# Altium schematic symbol library IC.SchLib: 555 symbols (part 7 of 15)
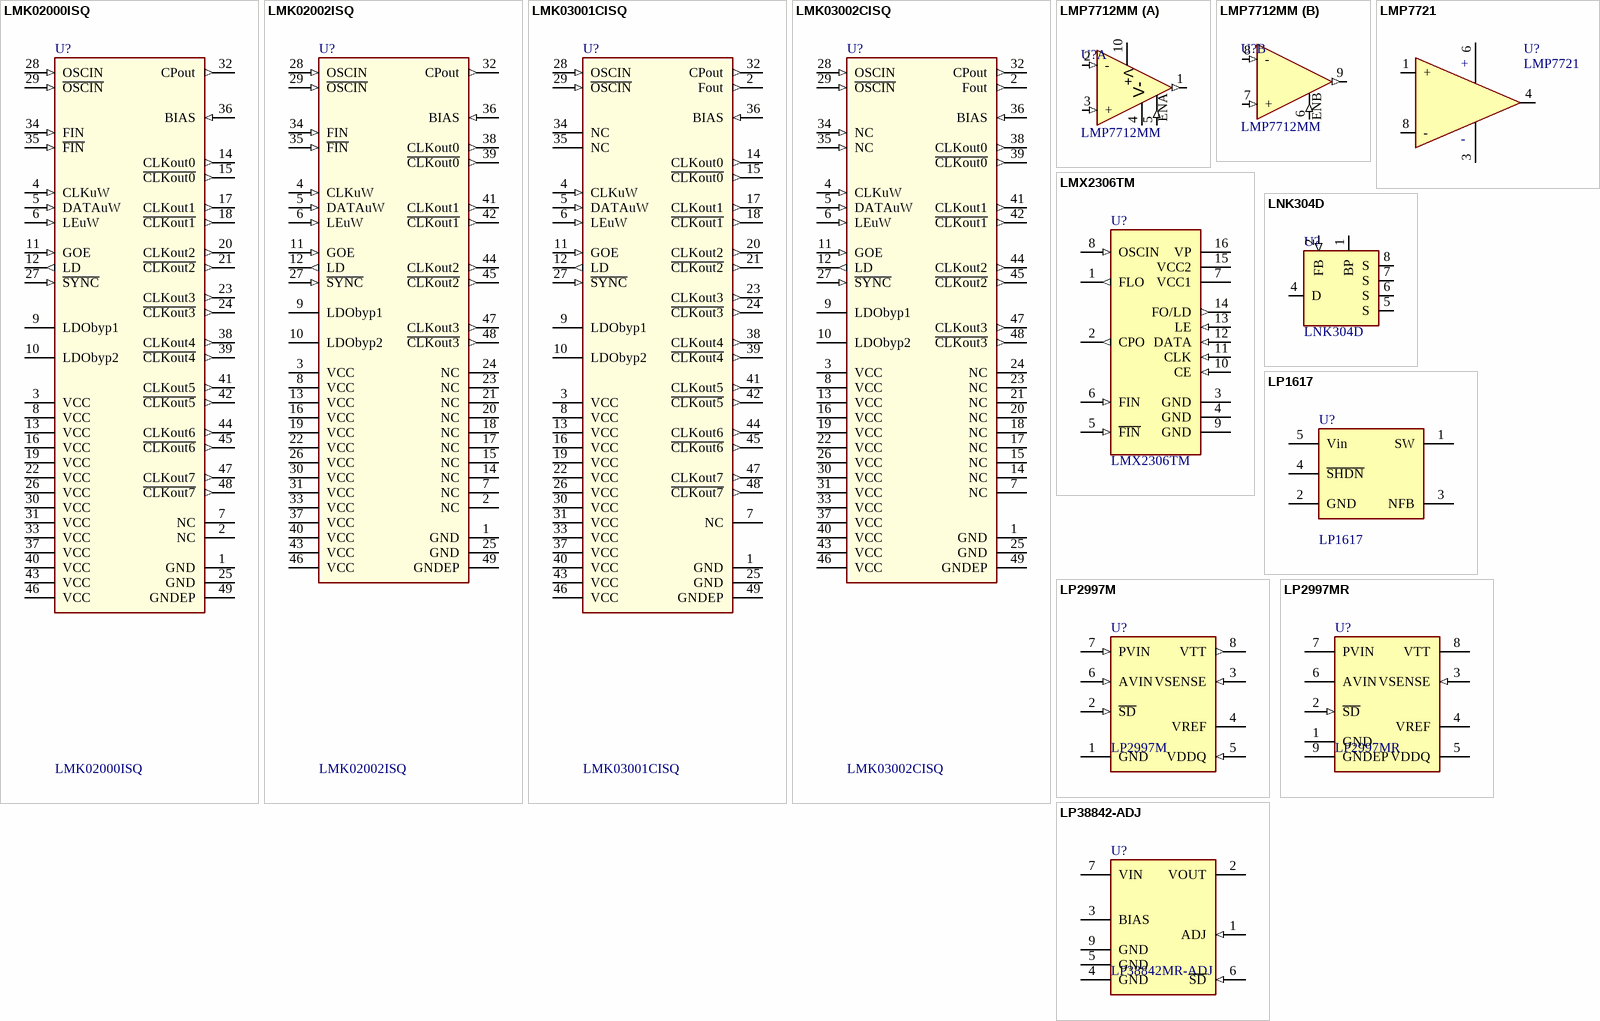
[diagram p76: symbols LMK02000ISQ to LP38842-ADJ]

## LMK03002CISQ
designator U?
Precision Clock Conditioner with Integrated VCO; QFN48; Manufacturer: National Semiconductors; Comment2: 1.64GHz 400fs 3.3V; Sort: 510; Tech: SMDR; Manufacturer No: LMK03002CISQ; Package: QFN48; Price: 0
footprint QFN48-1 (QFN48; 48 Leads; Body Width 7.0 mm; Pitch 0.5 mm)
pins: 1 GND (power), 2 Fout (out), 3 VCC (power), 4 CLKuW (in), 5 DATAuW (in), 6 LEuW (in), 7 NC, 8 VCC (power), 9 LDObyp1, 10 LDObyp2, 11 GOE (in), 12 LD (out), 13 VCC (power), 14 NC, 15 NC, 16 VCC (power), 17 NC, 18 NC, 19 VCC (power), 20 NC, 21 NC, 22 VCC (power), 23 NC, 24 NC, 25 GND (power), 26 VCC (power), 27 ~{SYNC} (in), 28 OSCIN (in), 29 ~{OSCIN} (in), 30 VCC (power), 31 VCC (power), 32 CPout (out), 33 VCC (power), 34 NC (in), 35 NC (in), 36 BIAS (in), 37 VCC (power), 38 CLKout0 (out), 39 ~{CLKout0} (out), 40 VCC (power), 41 CLKout1 (out), 42 ~{CLKout1} (out), 43 VCC (power), 44 CLKout2 (out), 45 ~{CLKout2} (out), 46 VCC (power), 47 CLKout3 (out), 48 ~{CLKout3} (out), 49 GNDEP (power)

## LMP7712MM
designator U?
Precision low noise operational amplifier; Manufacturer: National, Farnell; Manufacturer No: LMP7712MM, 1312609; Comment2: 1.8..5.5Vcc 1.15mAcc 150uVoffs 5.8nVnoise (AD3A); Sort: 510; Tech: SMDR; Package: MSOP10; Price: 2.17
footprint MSOP10-1 (MSOP 10pin 3x3mm R0.5mm)
part A pins: 1 OUT (out), 2 - (in), 3 + (in), 4 -V (power), 5 ENA (in), 10 +V (power)
part B pins: 6 ENA (in), 7 + (in), 8 - (in), 9 OUT (out)
part A text: V+; V-
part B text: ENB

## LMP7721
designator U?
3 Femtoampere Input Bias Current Precision Amplifier; Manufacturer: National Semiconductor; Manufacturer No: LMP7721MA; Sort: 510; Tech: THDW; Package: SOIC8; Price: 0
footprint SOIC8-1
pins: 1 +, 3 V-, 4 OUT, 6 V+, 8 -

## LMX2306TM
designator U?
Low power RF frequency synthesizer 550MHz; Manufacturer: National Semiconductors; Sort: 510; Tech: SMDR; Manufacturer No: LMX2306TM; Package: TSSOP16; Price: 0
footprint TSSOP16 (TSSOP16 5x4.4mm R0.65mm)
pins: 1 FLO (out), 2 CPO (out), 3 GND (power), 4 GND (power), 5 ~{FIN} (in), 6 FIN (in), 7 VCC1 (power), 8 OSCIN (in), 9 GND (power), 10 CE (in), 11 CLK (in), 12 DATA (in), 13 LE (in), 14 FO/LD (out), 15 VCC2 (power), 16 VP (power)

## LNK304D
designator U?
Off-Line Switcher SOIC8; Manufacturer: Power Integrations; Comment2: 120mA, 700V; Sort: 510; Tech: SMDR; Manufacturer No: LNK304D; Package: SOIC8; Price: 0
footprint SOIC8-7 (SOIC8 7pin R1.27mm)
pins: 1 BP, 2 FB (in), 4 D (power), 5 S (power), 6 S (power), 7 S (power), 8 S (power)

## LP1617
designator U?
Micropower Inverting DC/DC Converter in SOT-23; Manufacturer: Linear Technology; Manufacturer No: LT1617ES5; Sort: 510; Tech: SMDR; Package: SOT-23; Price: 0
footprint SOT23-5
pins: 1 SW, 2 GND (power), 3 NFB, 4 ~{SHDN}, 5 Vin (power)

## LP2997M
designator U?
DDR-II Termination Regulator; Manufacturer: National; Sort: 510; Tech: SMDR; Manufacturer No: LP2997M; Package: SOIC8; Price: 0
footprint SOIC8-1
pins: 1 GND (power), 2 ~{SD} (in), 3 VSENSE (in), 4 VREF (power), 5 VDDQ (in), 6 AVIN (in), 7 PVIN (in), 8 VTT (out)

## LP2997MR
designator U?
DDR-II Termination Regulator; Manufacturer: National; Sort: 510; Tech: SMDR; Manufacturer No: LP2997MR; Package: PSOP8; Price: 0
footprint MSOP8 (MSOP 8pin with power pad R0.5mm)
pins: 1 GND (power), 2 ~{SD} (in), 3 VSENSE (in), 4 VREF (power), 5 VDDQ (power), 6 AVIN (power), 7 PVIN (power), 8 VTT (power), 9 GNDEP (power)

## LP38842-ADJ
designator U?, comment LP38842MR-ADJ
LDO regulator PSOP8; Manufacturer: National; Comment2: 5.5Vinmax, 1.5Voutmax, 1.5A 0.115Vdrop; Sort: 510; Tech: SMDR; Manufacturer No: LP38842MR-ADJ; Package: SOIC8 PowerPad; Price: 0
footprint SOIC8PP-1
pins: 1 ADJ (in), 2 VOUT (power), 3 BIAS (power), 4 GND (power), 5 GND (power), 6 ~{SD} (in), 7 VIN (power), 9 GND (power)

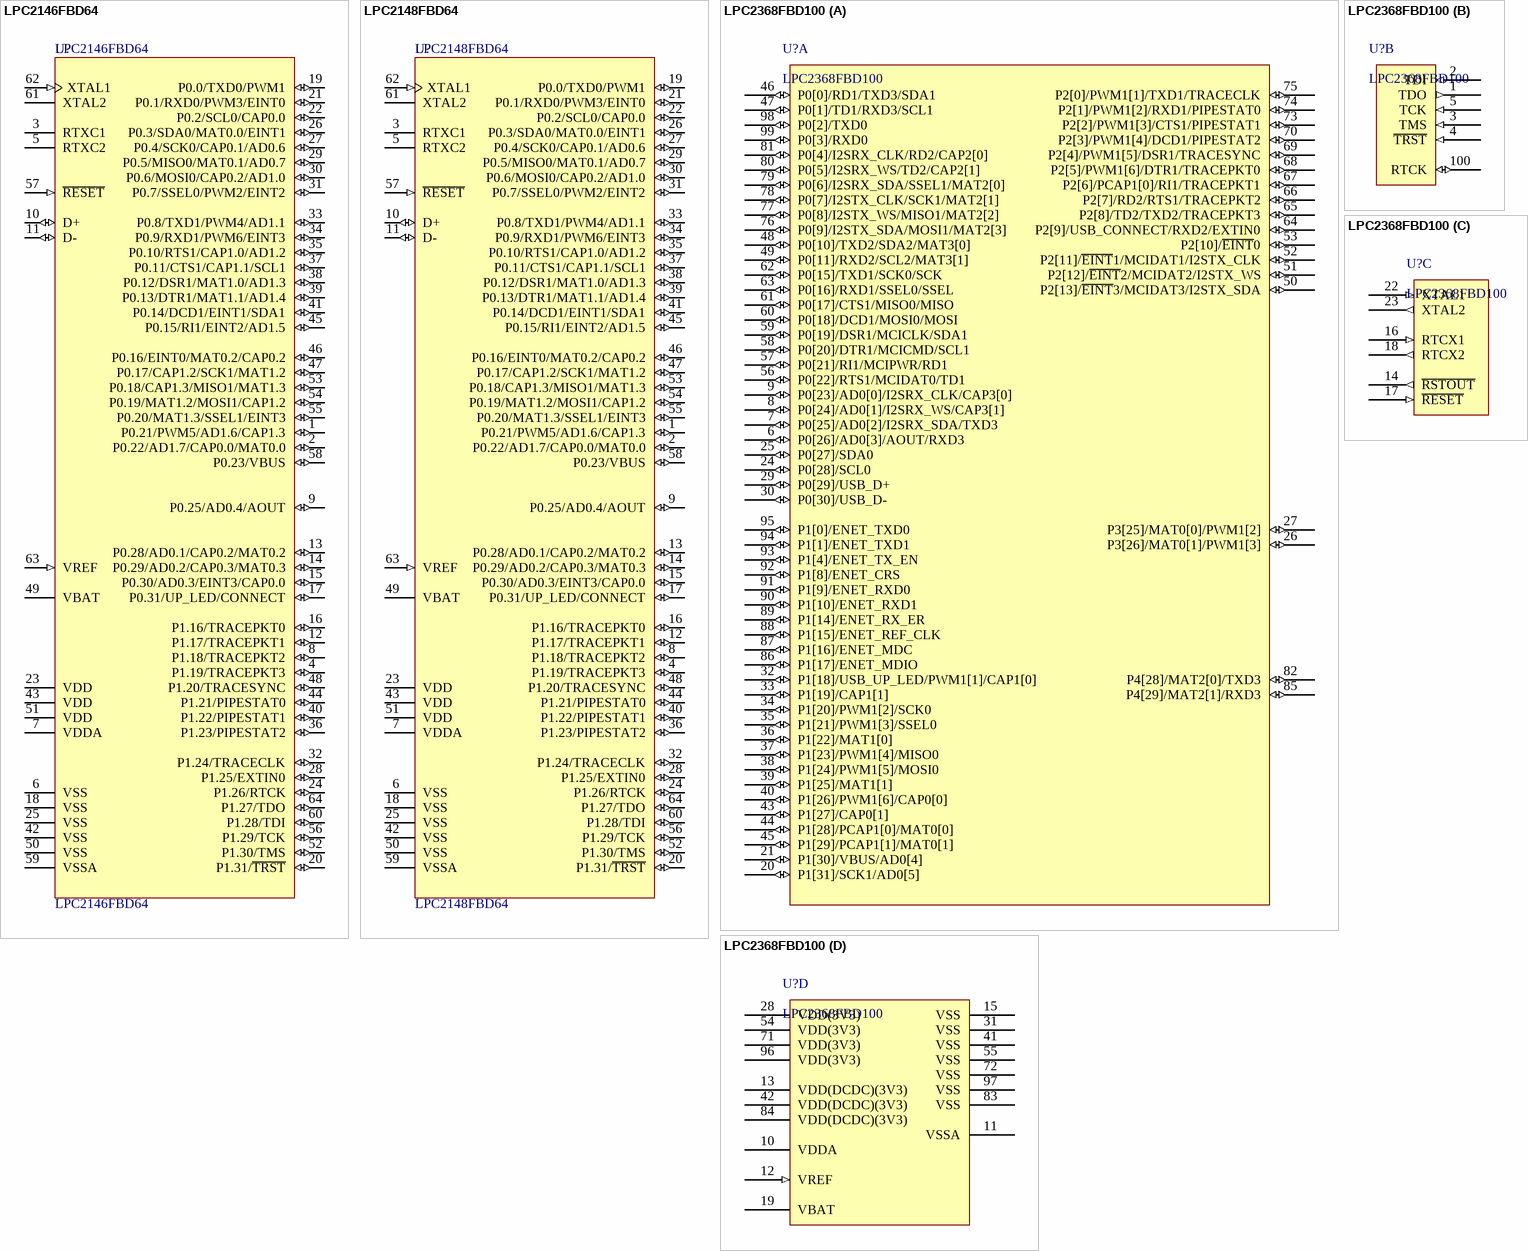
[diagram p27: symbols LPC2146FBD64 to LPC2368FBD100]

## LPC2146FBD64
designator U?
ARM7 16/32-Bit Microcontroller, 256KB Flash, 32KB RAM (+8KB USB DMA shared), 2KB USB RAM, 64-Lead LQFP; Manufacturer: NXP; Sort: 510; Tech: SMDR; Package: SOT314-2; Price: 0; Manufacturer No: LPC2146FBD64
footprint SOT314-2_N (Thin QFP, 64-Leads, Body 10x10mm, Pitch 0.5mm, IPC Medium Density)
pins: 1 P0.21/PWM5/AD1.6/CAP1.3 (io), 2 P0.22/AD1.7/CAP0.0/MAT0.0 (io), 3 RTXC1, 4 P1.19/TRACEPKT3 (io), 5 RTXC2, 6 VSS (power), 7 VDDA (power), 8 P1.18/TRACEPKT2 (io), 9 P0.25/AD0.4/AOUT (io), 10 D+ (io), 11 D- (io), 12 P1.17/TRACEPKT1 (io), 13 P0.28/AD0.1/CAP0.2/MAT0.2 (io), 14 P0.29/AD0.2/CAP0.3/MAT0.3 (io), 15 P0.30/AD0.3/EINT3/CAP0.0 (io), 16 P1.16/TRACEPKT0 (io), 17 P0.31/UP_LED/CONNECT (io), 18 VSS (power), 19 P0.0/TXD0/PWM1 (io), 20 P1.31/~{TRST} (io), 21 P0.1/RXD0/PWM3/EINT0 (io), 22 P0.2/SCL0/CAP0.0 (io), 23 VDD (power), 24 P1.26/RTCK (io), 25 VSS (power), 26 P0.3/SDA0/MAT0.0/EINT1 (io), 27 P0.4/SCK0/CAP0.1/AD0.6 (io), 28 P1.25/EXTIN0 (io), 29 P0.5/MISO0/MAT0.1/AD0.7 (io), 30 P0.6/MOSI0/CAP0.2/AD1.0 (io), 31 P0.7/SSEL0/PWM2/EINT2 (io), 32 P1.24/TRACECLK (io), 33 P0.8/TXD1/PWM4/AD1.1 (io), 34 P0.9/RXD1/PWM6/EINT3 (io), 35 P0.10/RTS1/CAP1.0/AD1.2 (io), 36 P1.23/PIPESTAT2 (io), 37 P0.11/CTS1/CAP1.1/SCL1 (io), 38 P0.12/DSR1/MAT1.0/AD1.3 (io), 39 P0.13/DTR1/MAT1.1/AD1.4 (io), 40 P1.22/PIPESTAT1 (io), 41 P0.14/DCD1/EINT1/SDA1 (io), 42 VSS (power), 43 VDD (power), 44 P1.21/PIPESTAT0 (io), 45 P0.15/RI1/EINT2/AD1.5 (io), 46 P0.16/EINT0/MAT0.2/CAP0.2 (io), 47 P0.17/CAP1.2/SCK1/MAT1.2 (io), 48 P1.20/TRACESYNC (io), 49 VBAT (power), 50 VSS (power), 51 VDD (power), 52 P1.30/TMS (io), 53 P0.18/CAP1.3/MISO1/MAT1.3 (io), 54 P0.19/MAT1.2/MOSI1/CAP1.2 (io), 55 P0.20/MAT1.3/SSEL1/EINT3 (io), 56 P1.29/TCK (io), 57 ~{RESET} (in), 58 P0.23/VBUS (io), 59 VSSA (power), 60 P1.28/TDI (io), 61 XTAL2, 62 XTAL1 (in), 63 VREF (in), 64 P1.27/TDO (io)

## LPC2148FBD64
designator U?
ARM7 16/32-Bit Microcontroller, 512KB Flash, 32KB RAM (+8KB USB DMA shared), 2KB USB RAM, 64-Lead LQFP; Manufacturer: NXP; Sort: 510; Tech: SMDR; Package: SOT314-2; Price: 0; Manufacturer No: LPC2148FBD64
footprint SOT314-2_N (Thin QFP, 64-Leads, Body 10x10mm, Pitch 0.5mm, IPC Medium Density)
pins: 1 P0.21/PWM5/AD1.6/CAP1.3 (io), 2 P0.22/AD1.7/CAP0.0/MAT0.0 (io), 3 RTXC1, 4 P1.19/TRACEPKT3 (io), 5 RTXC2, 6 VSS (power), 7 VDDA (power), 8 P1.18/TRACEPKT2 (io), 9 P0.25/AD0.4/AOUT (io), 10 D+ (io), 11 D- (io), 12 P1.17/TRACEPKT1 (io), 13 P0.28/AD0.1/CAP0.2/MAT0.2 (io), 14 P0.29/AD0.2/CAP0.3/MAT0.3 (io), 15 P0.30/AD0.3/EINT3/CAP0.0 (io), 16 P1.16/TRACEPKT0 (io), 17 P0.31/UP_LED/CONNECT (io), 18 VSS (power), 19 P0.0/TXD0/PWM1 (io), 20 P1.31/~{TRST} (io), 21 P0.1/RXD0/PWM3/EINT0 (io), 22 P0.2/SCL0/CAP0.0 (io), 23 VDD (power), 24 P1.26/RTCK (io), 25 VSS (power), 26 P0.3/SDA0/MAT0.0/EINT1 (io), 27 P0.4/SCK0/CAP0.1/AD0.6 (io), 28 P1.25/EXTIN0 (io), 29 P0.5/MISO0/MAT0.1/AD0.7 (io), 30 P0.6/MOSI0/CAP0.2/AD1.0 (io), 31 P0.7/SSEL0/PWM2/EINT2 (io), 32 P1.24/TRACECLK (io), 33 P0.8/TXD1/PWM4/AD1.1 (io), 34 P0.9/RXD1/PWM6/EINT3 (io), 35 P0.10/RTS1/CAP1.0/AD1.2 (io), 36 P1.23/PIPESTAT2 (io), 37 P0.11/CTS1/CAP1.1/SCL1 (io), 38 P0.12/DSR1/MAT1.0/AD1.3 (io), 39 P0.13/DTR1/MAT1.1/AD1.4 (io), 40 P1.22/PIPESTAT1 (io), 41 P0.14/DCD1/EINT1/SDA1 (io), 42 VSS (power), 43 VDD (power), 44 P1.21/PIPESTAT0 (io), 45 P0.15/RI1/EINT2/AD1.5 (io), 46 P0.16/EINT0/MAT0.2/CAP0.2 (io), 47 P0.17/CAP1.2/SCK1/MAT1.2 (io), 48 P1.20/TRACESYNC (io), 49 VBAT (power), 50 VSS (power), 51 VDD (power), 52 P1.30/TMS (io), 53 P0.18/CAP1.3/MISO1/MAT1.3 (io), 54 P0.19/MAT1.2/MOSI1/CAP1.2 (io), 55 P0.20/MAT1.3/SSEL1/EINT3 (io), 56 P1.29/TCK (io), 57 ~{RESET} (in), 58 P0.23/VBUS (io), 59 VSSA (power), 60 P1.28/TDI (io), 61 XTAL2, 62 XTAL1 (in), 63 VREF (in), 64 P1.27/TDO (io)

## LPC2368FBD100
designator U?
ARM7 16/32-Bit Microcontroller, 512KB Flash, 58KB RAM, 4 Channel CAN, 100-Lead LQFP; Code_IEC: 136E20; Published: 17-Aug-2007; DatasheetVersion: rev.01, Jan-2007; PackageVersion: Feb-2003; PackageReference: SOT407-1; Publisher: Altium Limited; PackageDescription: 100-Pin Plastic Low Profile Quad Flat Pack, LQFP100; Code_JEDEC: MS-026; ComponentLink1Description: Manufacturer Link; ComponentLink1URL: http://www.nxp.com/; ComponentLink2Description: Datasheet; ComponentLink2URL: http://www.standardics.nxp.com/products/lpc2000/datasheet/lpc2364.lpc2366.lpc2368.pdf
footprint SOT407-1_N (Thin QFP, 100-Leads, Body 14x14mm, Pitch 0.5mm, IPC Medium Density)
footprint SOT407-1_L (Thin QFP, 100-Leads, Body 14x14mm, Pitch 0.5mm, IPC High Density)
footprint SOT407-1_M (Thin QFP, 100-Leads, Body 14x14mm, Pitch 0.5mm, IPC Low Density)
3D model LPC2368-QFP100 (100-Pin Plastic Low Profile Quad Flat Pack, LQFP100)
part A pins: 6 P0[26]/AD0[3]/AOUT/RXD3 (io), 7 P0[25]/AD0[2]/I2SRX_SDA/TXD3 (io), 8 P0[24]/AD0[1]/I2SRX_WS/CAP3[1] (io), 9 P0[23]/AD0[0]/I2SRX_CLK/CAP3[0] (io), 20 P1[31]/SCK1/AD0[5] (io), 21 P1[30]/VBUS/AD0[4] (io), 24 P0[28]/SCL0 (io), 25 P0[27]/SDA0 (io), 26 P3[26]/MAT0[1]/PWM1[3] (io), 27 P3[25]/MAT0[0]/PWM1[2] (io), 29 P0[29]/USB_D+ (io), 30 P0[30]/USB_D- (io), 32 P1[18]/USB_UP_LED/PWM1[1]/CAP1[0] (io), 33 P1[19]/CAP1[1] (io), 34 P1[20]/PWM1[2]/SCK0 (io), 35 P1[21]/PWM1[3]/SSEL0 (io), 36 P1[22]/MAT1[0] (io), 37 P1[23]/PWM1[4]/MISO0 (io), 38 P1[24]/PWM1[5]/MOSI0 (io), 39 P1[25]/MAT1[1] (io), 40 P1[26]/PWM1[6]/CAP0[0] (io), 43 P1[27]/CAP0[1] (io), 44 P1[28]/PCAP1[0]/MAT0[0] (io), 45 P1[29]/PCAP1[1]/MAT0[1] (io), 46 P0[0]/RD1/TXD3/SDA1 (io), 47 P0[1]/TD1/RXD3/SCL1 (io), 48 P0[10]/TXD2/SDA2/MAT3[0] (io), 49 P0[11]/RXD2/SCL2/MAT3[1] (io), 50 P2[13]/~{EINT}3/MCIDAT3/I2STX_SDA (io), 51 P2[12]/~{EINT}2/MCIDAT2/I2STX_WS (io), 52 P2[11]/~{EINT}1/MCIDAT1/I2STX_CLK (io), 53 P2[10]/~{EINT}0 (io), 56 P0[22]/RTS1/MCIDAT0/TD1 (io), 57 P0[21]/RI1/MCIPWR/RD1 (io), 58 P0[20]/DTR1/MCICMD/SCL1 (io), 59 P0[19]/DSR1/MCICLK/SDA1 (io), 60 P0[18]/DCD1/MOSI0/MOSI (io), 61 P0[17]/CTS1/MISO0/MISO (io), 62 P0[15]/TXD1/SCK0/SCK (io), 63 P0[16]/RXD1/SSEL0/SSEL (io), 64 P2[9]/USB_CONNECT/RXD2/EXTIN0 (io), 65 P2[8]/TD2/TXD2/TRACEPKT3 (io), 66 P2[7]/RD2/RTS1/TRACEPKT2 (io), 67 P2[6]/PCAP1[0]/RI1/TRACEPKT1 (io), 68 P2[5]/PWM1[6]/DTR1/TRACEPKT0 (io), 69 P2[4]/PWM1[5]/DSR1/TRACESYNC (io), 70 P2[3]/PWM1[4]/DCD1/PIPESTAT2 (io), 73 P2[2]/PWM1[3]/CTS1/PIPESTAT1 (io), 74 P2[1]/PWM1[2]/RXD1/PIPESTAT0 (io), 75 P2[0]/PWM1[1]/TXD1/TRACECLK (io), 76 P0[9]/I2STX_SDA/MOSI1/MAT2[3] (io), 77 P0[8]/I2STX_WS/MISO1/MAT2[2] (io), 78 P0[7]/I2STX_CLK/SCK1/MAT2[1] (io), 79 P0[6]/I2SRX_SDA/SSEL1/MAT2[0] (io), 80 P0[5]/I2SRX_WS/TD2/CAP2[1] (io), 81 P0[4]/I2SRX_CLK/RD2/CAP2[0] (io), 82 P4[28]/MAT2[0]/TXD3 (io), 85 P4[29]/MAT2[1]/RXD3 (io), 86 P1[17]/ENET_MDIO (io), 87 P1[16]/ENET_MDC (io), 88 P1[15]/ENET_REF_CLK (io), 89 P1[14]/ENET_RX_ER (io), 90 P1[10]/ENET_RXD1 (io), 91 P1[9]/ENET_RXD0 (io), 92 P1[8]/ENET_CRS (io), 93 P1[4]/ENET_TX_EN (io), 94 P1[1]/ENET_TXD1 (io), 95 P1[0]/ENET_TXD0 (io), 98 P0[2]/TXD0 (io), 99 P0[3]/RXD0 (io)
part B pins: 1 TDO (out), 2 TDI (in), 3 TMS (in), 4 ~{TRST} (in), 5 TCK (in), 100 RTCK (io)
part C pins: 14 ~{RSTOUT} (out), 16 RTCX1 (in), 17 ~{RESET} (in), 18 RTCX2 (out), 22 XTAL1 (in), 23 XTAL2 (out)
part D pins: 10 VDDA (power), 11 VSSA (power), 12 VREF (in), 13 VDD(DCDC)(3V3) (power), 15 VSS (power), 19 VBAT (power), 28 VDD(3V3) (power), 31 VSS (power), 41 VSS (power), 42 VDD(DCDC)(3V3) (power), 54 VDD(3V3) (power), 55 VSS (power), 71 VDD(3V3) (power), 72 VSS (power), 83 VSS (power), 84 VDD(DCDC)(3V3) (power), 96 VDD(3V3) (power), 97 VSS (power)

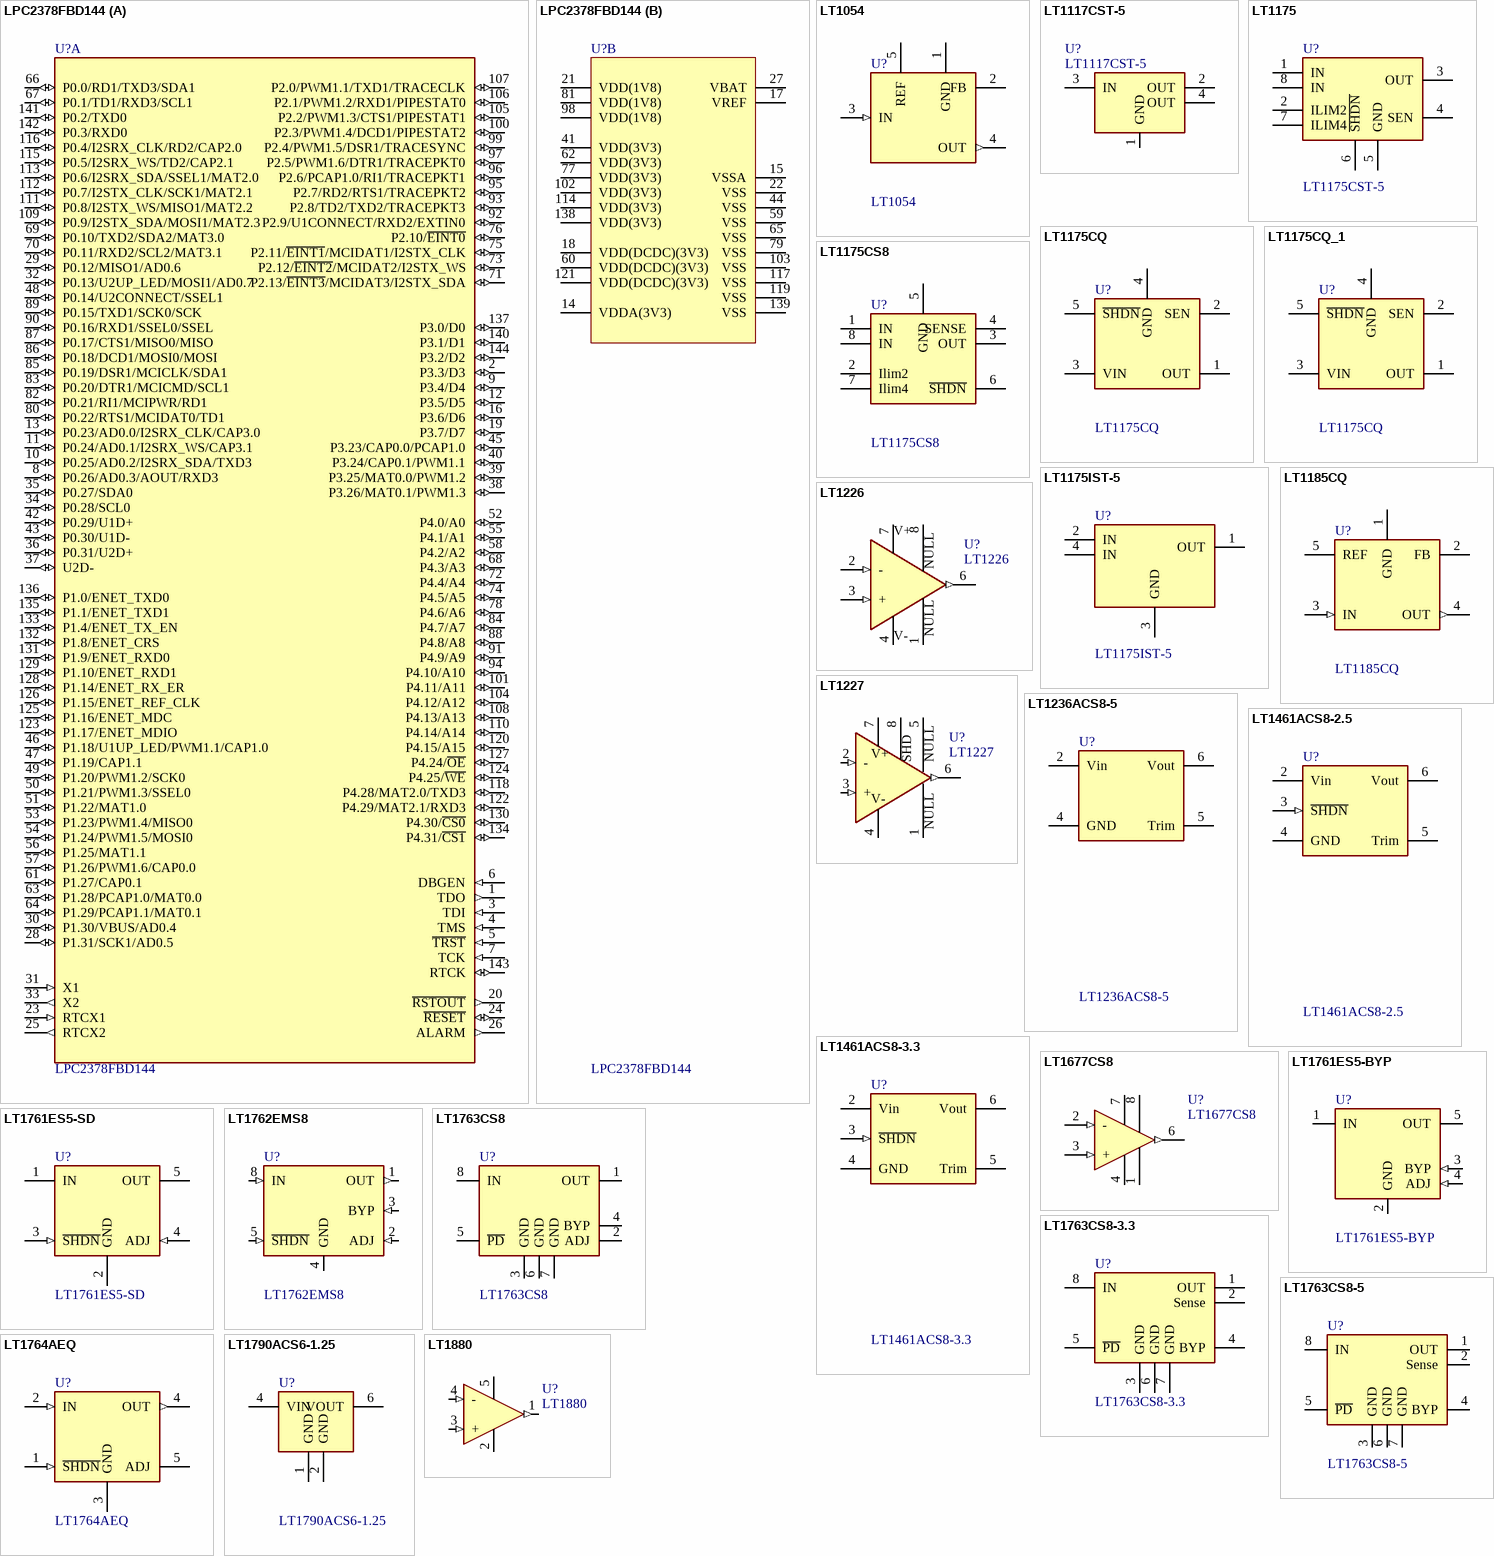
[diagram p28: symbols LPC2378FBD144 to LT1880]

## LPC2378FBD144
designator U?
ARM7 16/32-Bit Microcontroller, 512KB Flash, 58KB RAM, Ethernet, USB2, 144-Lead LQFP; Manufacturer: NXP; Sort: 510; Tech: SMDR; Package: LQFP144; Manufacturer No: LPC2378FBD144; Price: 0
footprint SOT486-1_N (Thin QFP, 144-Leads, Body 20x20mm, Pitch 0.5mm, IPC Medium Density)
part A pins: 1 TDO (out), 2 P3.3/D3 (io), 3 TDI (in), 4 TMS (in), 5 ~{TRST} (in), 6 DBGEN (in), 7 TCK (in), 8 P0.26/AD0.3/AOUT/RXD3 (io), 9 P3.4/D4 (io), 10 P0.25/AD0.2/I2SRX_SDA/TXD3 (io), 11 P0.24/AD0.1/I2SRX_WS/CAP3.1 (io), 12 P3.5/D5 (io), 13 P0.23/AD0.0/I2SRX_CLK/CAP3.0 (io), 16 P3.6/D6 (io), 19 P3.7/D7 (io), 20 ~{RSTOUT} (out), 23 RTCX1 (in), 24 ~{RESET} (io), 25 RTCX2 (out), 26 ALARM (out), 28 P1.31/SCK1/AD0.5 (io), 29 P0.12/MISO1/AD0.6 (io), 30 P1.30/VBUS/AD0.4 (io), 31 X1 (in), 32 P0.13/U2UP_LED/MOSI1/AD0.7 (io), 33 X2 (out), 34 P0.28/SCL0 (io), 35 P0.27/SDA0 (io), 36 P0.31/U2D+ (io), 37 U2D- (io), 38 P3.26/MAT0.1/PWM1.3 (io), 39 P3.25/MAT0.0/PWM1.2 (io), 40 P3.24/CAP0.1/PWM1.1 (io), 42 P0.29/U1D+ (io), 43 P0.30/U1D- (io), 45 P3.23/CAP0.0/PCAP1.0 (io), 46 P1.18/U1UP_LED/PWM1.1/CAP1.0 (io), 47 P1.19/CAP1.1 (io), 48 P0.14/U2CONNECT/SSEL1 (io), 49 P1.20/PWM1.2/SCK0 (io), 50 P1.21/PWM1.3/SSEL0 (io), 51 P1.22/MAT1.0 (io), 52 P4.0/A0 (io), 53 P1.23/PWM1.4/MISO0 (io), 54 P1.24/PWM1.5/MOSI0 (io), 55 P4.1/A1 (io), 56 P1.25/MAT1.1 (io), 57 P1.26/PWM1.6/CAP0.0 (io), 58 P4.2/A2 (io), 61 P1.27/CAP0.1 (io), 63 P1.28/PCAP1.0/MAT0.0 (io), 64 P1.29/PCAP1.1/MAT0.1 (io), 66 P0.0/RD1/TXD3/SDA1 (io), 67 P0.1/TD1/RXD3/SCL1 (io), 68 P4.3/A3 (io), 69 P0.10/TXD2/SDA2/MAT3.0 (io), 70 P0.11/RXD2/SCL2/MAT3.1 (io), 71 P2.13/~{EINT3}/MCIDAT3/I2STX_SDA (io), 72 P4.4/A4 (io), 73 P2.12/~{EINT2}/MCIDAT2/I2STX_WS (io), 74 P4.5/A5 (io), 75 P2.11/~{EINT1}/MCIDAT1/I2STX_CLK (io), 76 P2.10/~{EINT0} (io), 78 P4.6/A6 (io), 80 P0.22/RTS1/MCIDAT0/TD1 (io), 82 P0.21/RI1/MCIPWR/RD1 (io), 83 P0.20/DTR1/MCICMD/SCL1 (io), 84 P4.7/A7 (io), 85 P0.19/DSR1/MCICLK/SDA1 (io), 86 P0.18/DCD1/MOSI0/MOSI (io), 87 P0.17/CTS1/MISO0/MISO (io), 88 P4.8/A8 (io), 89 P0.15/TXD1/SCK0/SCK (io), 90 P0.16/RXD1/SSEL0/SSEL (io), 91 P4.9/A9 (io), 92 P2.9/U1CONNECT/RXD2/EXTIN0 (io), 93 P2.8/TD2/TXD2/TRACEPKT3 (io), 94 P4.10/A10 (io), 95 P2.7/RD2/RTS1/TRACEPKT2 (io), 96 P2.6/PCAP1.0/RI1/TRACEPKT1 (io), 97 P2.5/PWM1.6/DTR1/TRACEPKT0 (io), 99 P2.4/PWM1.5/DSR1/TRACESYNC (io), 100 P2.3/PWM1.4/DCD1/PIPESTAT2 (io), 101 P4.11/A11 (io), 104 P4.12/A12 (io), 105 P2.2/PWM1.3/CTS1/PIPESTAT1 (io), 106 P2.1/PWM1.2/RXD1/PIPESTAT0 (io), 107 P2.0/PWM1.1/TXD1/TRACECLK (io), 108 P4.13/A13 (io), 109 P0.9/I2STX_SDA/MOSI1/MAT2.3 (io), 110 P4.14/A14 (io), 111 P0.8/I2STX_WS/MISO1/MAT2.2 (io), 112 P0.7/I2STX_CLK/SCK1/MAT2.1 (io), 113 P0.6/I2SRX_SDA/SSEL1/MAT2.0 (io), 115 P0.5/I2SRX_WS/TD2/CAP2.1 (io), 116 P0.4/I2SRX_CLK/RD2/CAP2.0 (io), 118 P4.28/MAT2.0/TXD3 (io), 120 P4.15/A15 (io), 122 P4.29/MAT2.1/RXD3 (io), 123 P1.17/ENET_MDIO (io), 124 P4.25/~{WE} (io), 125 P1.16/ENET_MDC (io), 126 P1.15/ENET_REF_CLK (io), 127 P4.24/~{OE} (io), 128 P1.14/ENET_RX_ER (io), 129 P1.10/ENET_RXD1 (io), 130 P4.30/~{CS0} (io), 131 P1.9/ENET_RXD0 (io), 132 P1.8/ENET_CRS (io), 133 P1.4/ENET_TX_EN (io), 134 P4.31/~{CS1} (io), 135 P1.1/ENET_TXD1 (io), 136 P1.0/ENET_TXD0 (io), 137 P3.0/D0 (io), 140 P3.1/D1 (io), 141 P0.2/TXD0 (io), 142 P0.3/RXD0 (io), 143 RTCK (io), 144 P3.2/D2 (io)
part B pins: 14 VDDA(3V3) (power), 15 VSSA (power), 17 VREF (power), 18 VDD(DCDC)(3V3) (power), 21 VDD(1V8) (power), 22 VSS (power), 27 VBAT (power), 41 VDD(3V3) (power), 44 VSS (power), 59 VSS (power), 60 VDD(DCDC)(3V3) (power), 62 VDD(3V3) (power), 65 VSS (power), 77 VDD(3V3) (power), 79 VSS (power), 81 VDD(1V8) (power), 98 VDD(1V8) (power), 102 VDD(3V3) (power), 103 VSS (power), 114 VDD(3V3) (power), 117 VSS (power), 119 VSS (power), 121 VDD(DCDC)(3V3) (power), 138 VDD(3V3) (power), 139 VSS (power)

## LT1054
designator U?
Switched-Capacitor Voltage  Converter with Regulator; Manufacturer: Linear Technologies; Manufacturer No: LT1054CS8; Comment2: 3.5V to 16V, 100mA; Sort: 510; Tech: SMDR; Package: SO8; Price: 0
footprint SO8
pins: 1 GND (power), 2 FB, 3 IN (in), 4 OUT (out), 5 REF

## LT1117CST-5
designator U?
+5V LDO regulator SOT223; Manufacturer No: LT1117CST-5#PBF, 1503421; Manufacturer: Linear, Farnell; Sort: 520; Tech: SMDR; Comment2: 6..12Vin 5Vout 0.8Aout; Package: SOT223; Price: 4.2
footprint SOT223
pins: 1 GND (power), 2 OUT (power), 3 IN (power), 4 OUT (power)

## LT1175
designator U?, comment LT1175CST-5
500mA Negative Low Dropout Micropower  Regulator; Manufacturer: Linear Technologies; Comment2: -5V, 0.5A, max -20Vin; Sort: 510; Tech: SMDR; Manufacturer No: LT1175CST-5; Package: SOT223; Price: 0
footprint SOIC8-1
pins: 1 IN (power), 2 ILIM2 (power), 3 OUT, 4 SEN, 5 GND (power), 6 ~{SHDN} (power), 7 ILIM4 (power), 8 IN

## LT1175CQ
designator U?
500mA Negative Low Dropout Micropower  Regulator; Manufacturer: Linear, Farnell; Manufacturer No: LT1175CQ#PBF, 1663389; Comment2: adj 0.5A, max -20Vin; Sort: 510; Tech: SMDR; Package: DDPAK; Price: 7
footprint DDPAK
pins: 1 OUT, 2 SEN, 3 VIN (power), 4 GND (power), 5 ~{SHDN} (power)

## LT1175CQ_1
designator U?, comment LT1175CQ
500mA Negative Low Dropout Micropower  Regulator; Manufacturer: Linear, Farnell; Manufacturer No: LT1175CQ#PBF, 1663389; Comment2: adj 0.5A, max -20Vin; Sort: 510; Tech: SMDR; Package: DDPAK; Price: 7
footprint DDPAK
pins: 1 OUT, 2 SEN, 3 VIN (power), 4 GND (power), 5 ~{SHDN} (power)

## LT1175CS8
designator U?
500mA Negative  Low Dropout Micropower  Regulator; Manufacturer: Linear Technologies; Sort: 510; Tech: SMDR; Manufacturer No: LT1175CS8; Package: SOIC8; Price: 0
footprint SO8
pins: 1 IN, 2 Ilim2, 3 OUT, 4 SENSE, 5 GND, 6 ~{SHDN}, 7 Ilim4, 8 IN

## LT1175IST-5
designator U?
500mA Negative Low Dropout Micropower  Regulator; Manufacturer: Linear, Farnell; Manufacturer No: LT1175CST-5#PBF, 1663391; Comment2: -5V, 0.5A, max -20Vin; Sort: 510; Tech: SMDR; Package: SOT223; Price: 6.3
footprint SOT223
pins: 1 OUT, 2 IN (power), 3 GND (power), 4 IN (power)

## LT1185CQ
designator U?
Negative Low drop regulator 3A; Manufacturer: Linear Technologies, Farnell; Manufacturer No: LT1185CQ#PBF; Comment2: adjVout 30Vin 3A 0.75Vdrop; Sort: 510; Tech: SMDR; Package: DDPak5; Price: 7.29; Supplier: Digi-Key; Supplier No: LT1185CQ#PBF-ND
footprint DDPAK
pins: 1 GND (power), 2 FB, 3 IN (in), 4 OUT (out), 5 REF

## LT1226
designator U?
Low Noise Very High Speed  Operational Amplifier; Manufacturer: Linear Tecnologies; Manufacturer No: LT1226CS8; Sort: 510; Tech: SMDR; Package: SOIC 8; Price: 0
footprint SOIC8-1
pins: 1 NULL, 2 - (in), 3 + (in), 4 -VS (power), 5 NC hidden, 6 OUT (out), 7 +VS (power), 8 NULL
text: V+; V-

## LT1227
designator U?
140MHz Video Current  Feedback Amplifier; Manufacturer: Linear Tecnology, Fanell, Digi-Key; Manufacturer No: LT1227CS8#PBF, 9560319, LT1227CS8#PBF-ND; Sort: 510; Tech: SMDR; Package: SOIC8; Price: 0
footprint SOIC8-1
pins: 1 NULL, 2 - (in), 3 + (in), 4 -VS (power), 5 NC hidden, 5 NULL, 6 OUT (out), 7 +VS (power), 8 +VS (power)
text: V+; SHD; V-

## LT1236ACS8-5
designator U?
5V precision reference; Manufacturer: Linear Technologies, Farnell; Manufacturer No: LT1236ACS8-5#PBF, 1273433; Comment2: 40Vin 5Vout 2ppm 0.05%; Sort: 510; Tech: SMDR; Package: SOIC8; Price: 0
footprint SOIC8-1
pins: 2 Vin (power), 4 GND (power), 5 Trim, 6 Vout (power)

## LT1461ACS8-2.5
designator U?
2.5V precision reference; Manufacturer: Linear Technologies, Farnell; Comment2: 20Vin 2.5Vout 3ppm 0.04%; Sort: 510; Tech: SMDR; Manufacturer No: LT1461ACS8-2.5; Package: SOIC8; Price: 0
footprint SOIC8-1
pins: 2 Vin (power), 3 ~{SHDN} (in), 4 GND (power), 5 Trim, 6 Vout (power)

## LT1461ACS8-3.3
designator U?
3.3V precision reference; Manufacturer: Linear Technologies, Farnell; Comment2: 20Vin 3.3Vout 3ppm 0.04%; Sort: 510; Tech: SMDR; Manufacturer No: LT1461ACS8-3.3; Package: SOIC8; Price: 0
footprint SOIC8-1
pins: 2 Vin (power), 3 ~{SHDN} (in), 4 GND (power), 5 Trim, 6 Vout (power)

## LT1677CS8
designator U?
Operational amplifier low noise 44V supply; Manufacturer: Linear Tecnologies; Sort: 510; Tech: SMDR; Manufacturer No: LT1677CS8; Package: SOIC 8; Price: 0
footprint SOIC8-1
pins: 1 VOS, 2 - (in), 3 + (in), 4 -VS (power), 5 NC hidden, 6 OUT (out), 7 +VS (power), 8 VOS

## LT1761ES5-BYP
designator U?
Low drop low noise adjustable regulator; Manufacturer: Linear Technologies; Manufacturer No: LT1761ES5-BYP#PBF; Comment2: 1.8-20Vin 1.22-20Vout 100mA 0.3Vdrop 20uVrms (LTGH); Sort: 510; Tech: SMDR; Package: SOT23-5; Price: 0
footprint SOT23-5
pins: 1 IN (power), 2 GND (power), 3 BYP (in), 4 ADJ (in), 5 OUT (power)

## LT1761ES5-SD
designator U?
Low drop low noise adjustable regulator; Manufacturer: Linear Technologies; Manufacturer No: LT1761ES5-SD#PBF; Comment2: 1.8-20Vin 1.22-20Vout 100mA 0.3Vdrop 20uVrms (LTGH); Sort: 510; Tech: SMDR; Package: SOT23-5; Price: 0
footprint SOT23-5
pins: 1 IN (power), 2 GND (power), 3 ~{SHDN} (in), 4 ADJ (in), 5 OUT (power)

## LT1762EMS8
designator U?
Low drop low noise negative regulator 150mA  MSOP8; Manufacturer: Linear Technologies, Farnell; Manufacturer No: LT1762EMS8#PBF, 1273608; Comment2: 1.22..20Vout 20Vin 150mA 20uVrms; Sort: 510; Tech: SMDR; Package: MSOP8; Price: 2
footprint MSOP8N
pins: 1 OUT (out), 2 ADJ (in), 3 BYP (in), 4 GND (power), 5 ~{SHDN} (in), 8 IN (in)

## LT1763CS8
designator U?
Low drop low noise regulator 0.5A; Manufacturer: Linear Technology, Farnell; Manufacturer No: LT1763CS8#PBF, 1273614; Comment2: 1.8..20Vin 0.3Vdrop 0.5A 20uVrms; Sort: 510; Tech: SMDR; Package: SOIC8; Price: 0
footprint SOIC8-1
pins: 1 OUT, 2 ADJ, 3 GND, 4 BYP, 5 ~{PD}, 6 GND, 7 GND, 8 IN

## LT1763CS8-3.3
designator U?
Low drop low noise regulator 0.5A; Manufacturer: Linear Technology, Farnell; Manufacturer No: LT1763CS8-3.3#PBF, 1273617; Comment2: 1.8..20Vin 3.3Vout 0.3Vdrop 0.5A 20uVrms (176333); Sort: 510; Tech: SMDR; Package: SOIC8; Price: 4.75
footprint SOIC8-1
pins: 1 OUT, 2 Sense, 3 GND, 4 BYP, 5 ~{PD}, 6 GND, 7 GND, 8 IN

## LT1763CS8-5
designator U?
Low drop low noise regulator 0.5A; Manufacturer: Linear Technology, Farnell; Manufacturer No: LT1763CS8-5#PBF, 1273618; Comment2: 1.8..20Vin 5Vout 0.3Vdrop 0.5A 20uVrms (17635); Sort: 510; Tech: SMDR; Package: SOIC8; Price: 4,7
footprint SOIC8-1
pins: 1 OUT, 2 Sense, 3 GND, 4 BYP, 5 ~{PD}, 6 GND, 7 GND, 8 IN

## LT1764AEQ
designator U?
Low drop low noise regulator 3A  DDPak; Manufacturer: Linear Technology; Manufacturer No: LT1764AEQ#TRPBF; Comment2: 3A, 1.21 to 20Vout,; Sort: 510; Tech: SMDR; Package: DDPak5; Price: 8.58; Supplier: Digi-Key; Supplier No: LT1764AEQ#TRPBFCT-ND
footprint DDPAK
pins: 1 ~{SHDN} (in), 2 IN (in), 3 GND (power), 4 OUT (out), 5 ADJ (hiz)

## LT1790ACS6-1.25
designator U?
Low Dropout Reference Family SOT23; Manufacturer: Linear Technologies; Sort: 510; Tech: SMDR; Manufacturer No: LT1790ACS6-1.25; Package: SOT23-6; Price: 0
footprint SOT23-6
pins: 1 GND (power), 2 GND (power), 4 VIN (power), 6 VOUT (power)

## LT1880
designator U?
SOT-23, Rail-to-Rail Output,  Picoamp Input Current  Precision Op Amp; Manufacturer: Linear Technology, Farnell; Manufacturer No: LT1880CS5#TRMPBF, 1663802; Sort: 510; Tech: SMDR; Package: SOT23-5; Price: 0
footprint SOT23-5
pins: 1 OUT (out), 2 -V (power), 3 + (in), 4 - (in), 5 +V (power)

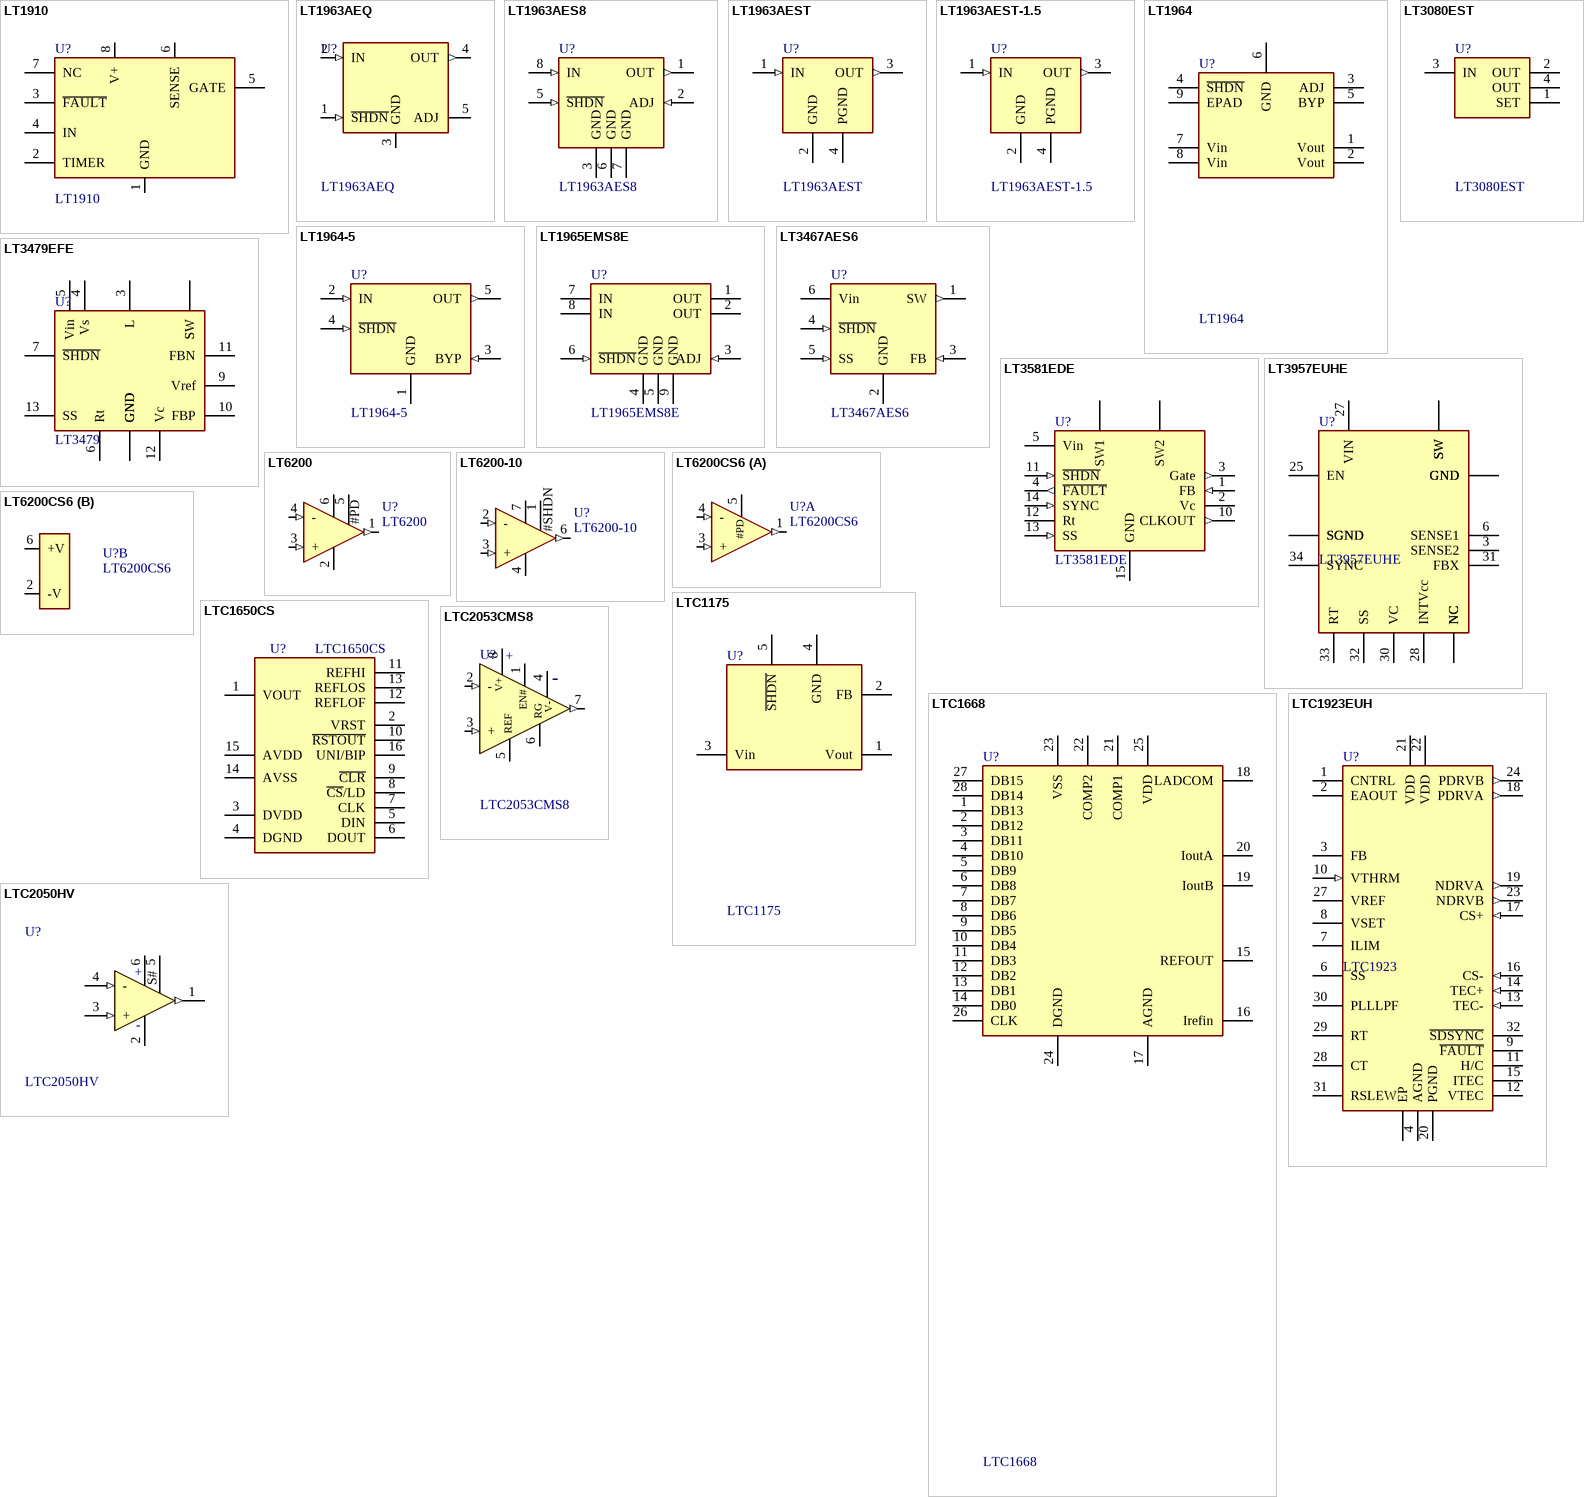
[diagram p29: symbols LT1910 to LTC2053CMS8]

## LT1910
designator U?
Protected High Side MOSFET Driver; Manufacturer: Linear Technology; Manufacturer No: LT1910ES8; Comment2: -15V to 60V; Sort: 510; Tech: SMDR; Package: SOIC8; Price: 0
footprint SOIC8-1
pins: 1 GND (power), 2 TIMER, 3 ~{FAULT}, 4 IN, 5 GATE, 6 SENSE, 7 NC, 8 V+ (power)

## LT1963AEQ
designator U?
Low drop low noise regulator 1.5A DDPak 5pin; Manufacturer: Linear Technologies; Comment2: 20Vin, 1.5A, 40uVrms 0.55Vdmax; Sort: 510; Tech: SMDR; Manufacturer No: LT1963AEQ; Package: DDPak5; Price: 0
footprint DDPAK
pins: 1 ~{SHDN} (in), 2 IN (in), 3 GND (power), 4 OUT (out), 5 ADJ (hiz)

## LT1963AES8
designator U?
Low drop low noise regulator 1.5A DDPak SOIC8; Manufacturer: Linear Technologies; Comment2: 20Vin, 1.5A, 40uVrms 0.55Vdmax; Sort: 510; Tech: SMDR; Manufacturer No: LT1963AES8; Package: SOIC8; Price: 0
footprint SOIC8-1
pins: 1 OUT (out), 2 ADJ (in), 3 GND (power), 5 ~{SHDN} (in), 6 GND (power), 7 GND (power), 8 IN (in)